# Altium footprint library microbuilder.PCBLIB: 422 footprints (part 2 of 27)
Each footprint in its own frame and in the unit in brackets; x right, y up, seen from the top. Pads: shape width x height; smd on the part's side, far side on the other; paste and mask are expansions set on the pad; w line width, h text height; cw(c..) or ccw(c..) is an arc to the next point about the centre after c.
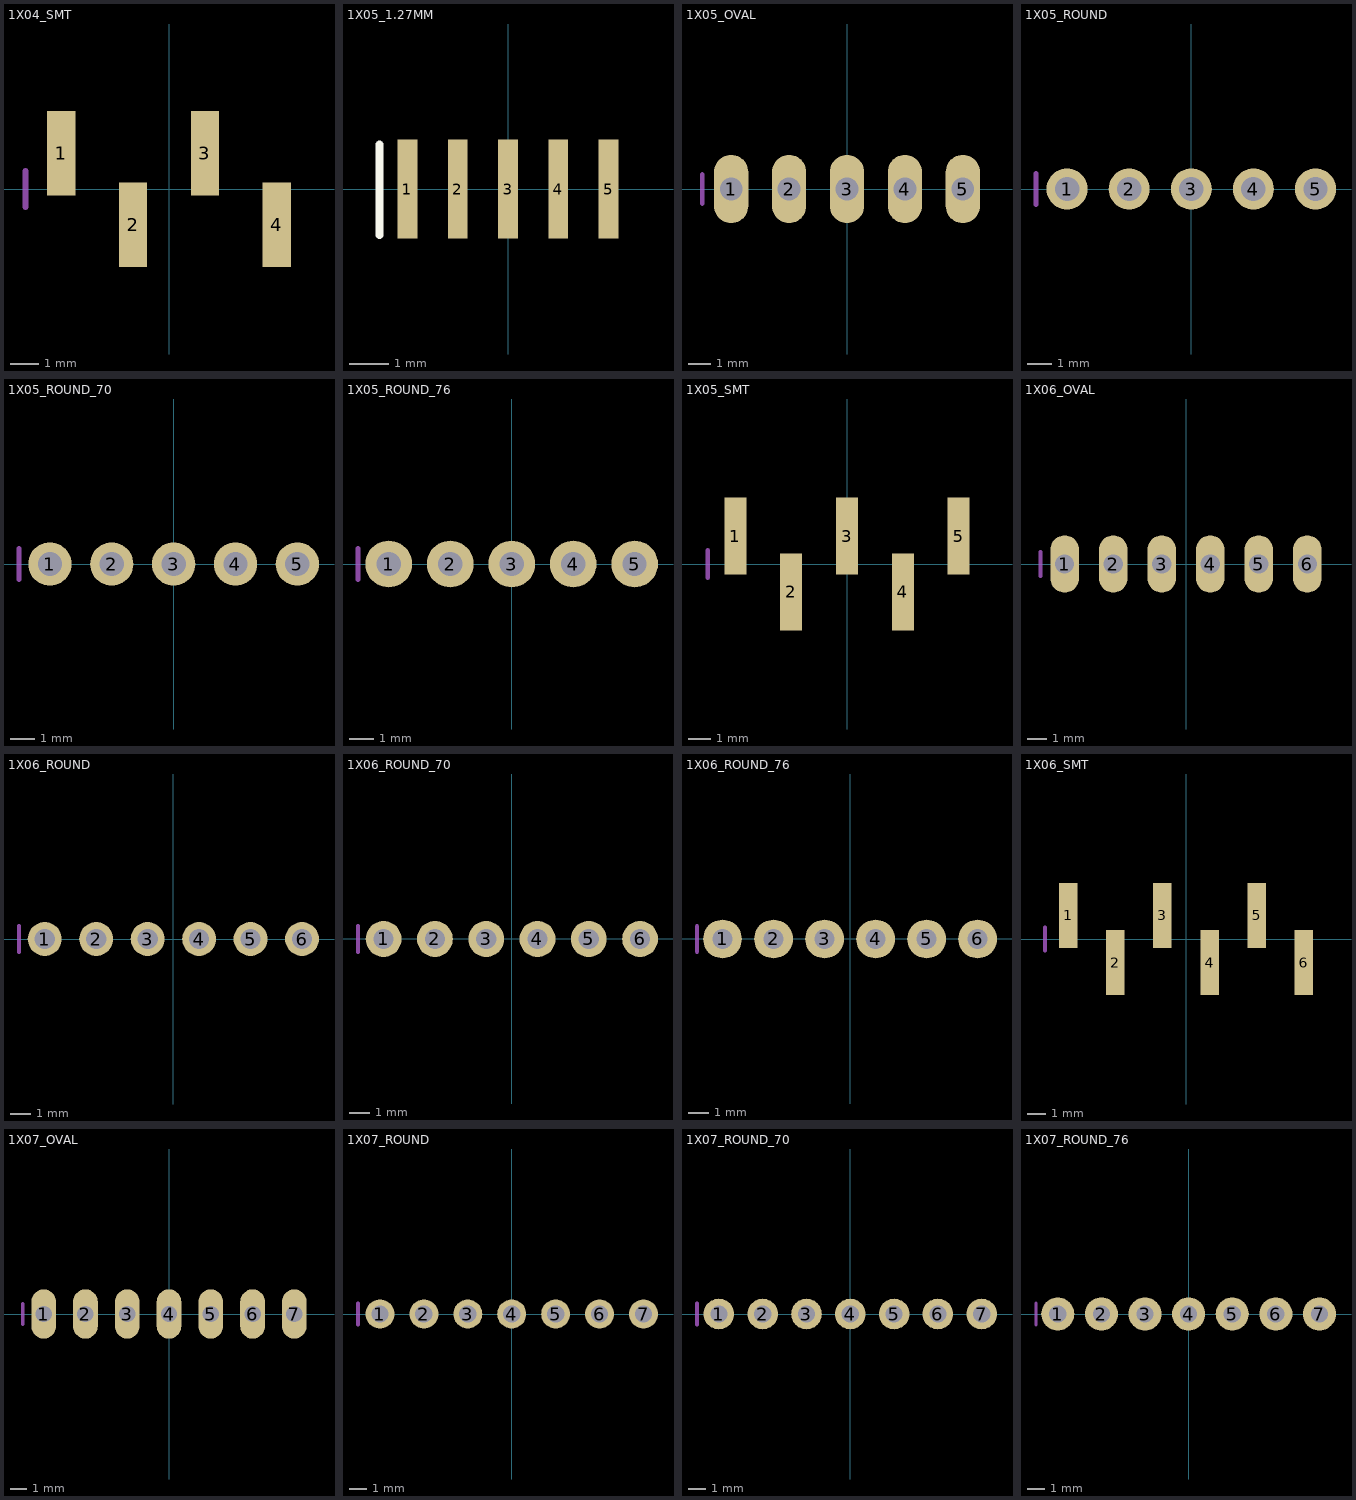
[diagram p1: the footprints below, top view; thin cyan lines are the x and y axes]

## 1X04_SMT [mm]
pads (4):
  rect 1x3 smd: 1(-3.81,1.27) 2(-1.27,-1.27) 3(1.27,1.27) 4(3.81,-1.27)
Mechanical 16:
  lines w0.203: -5.08,-0.635 -5.08,0.635

## 1X05_1.27MM [mm]
pads (5):
  rect 0.5x2.5 smd: 1(-2.54,0) 2(-1.27,0) 3(0,0) 4(1.27,0) 5(2.54,0)
Top Overlay:
  lines w0.203: -3.25,-1.159 -3.25,1.127

## 1X05_OVAL [mm]
pads (5):
  oval 1.5x3 hole 1: 1(-5.08,0) 2(-2.54,0) 3(0,0) 4(2.54,0) 5(5.08,0)
Mechanical 16:
  rectangle: 2.286,-0.254 2.794,0.254
  rectangle: -0.254,-0.254 0.254,0.254
  rectangle: -2.794,-0.254 -2.286,0.254
  rectangle: -5.334,-0.254 -4.826,0.254
  rectangle: 4.826,-0.254 5.334,0.254
  lines w0.203: -6.35,-0.635 -6.35,0.635

## 1X05_ROUND [mil]
pads (5):
  round 66 hole 39.37: 1(-200,0) 2(-100,0) 3(0,0) 4(100,0) 5(200,0)
Mechanical 16:
  rectangle: 90,-10 110,10
  rectangle: -10,-10 10,10
  rectangle: -110,-10 -90,10
  rectangle: -210,-10 -190,10
  rectangle: 190,-10 210,10
  lines w8: -250,-25 -250,25

## 1X05_ROUND_70 [mil]
pads (5):
  round 70 hole 39.37: 1(-200,0) 2(-100,0) 3(0,0) 4(100,0) 5(200,0)
Mechanical 16:
  rectangle: 90,-10 110,10
  rectangle: -10,-10 10,10
  rectangle: -110,-10 -90,10
  rectangle: -210,-10 -190,10
  rectangle: 190,-10 210,10
  lines w8: -250,-25 -250,25

## 1X05_ROUND_76 [mil]
pads (5):
  round 76 hole 39.37: 1(-200,0) 2(-100,0) 3(0,0) 4(100,0) 5(200,0)
Mechanical 16:
  rectangle: 90,-10 110,10
  rectangle: -10,-10 10,10
  rectangle: -110,-10 -90,10
  rectangle: -210,-10 -190,10
  rectangle: 190,-10 210,10
  lines w8: -250,-25 -250,25

## 1X05_SMT [mm]
pads (5):
  rect 1x3.5 smd: 1(-5.08,1.27) 2(-2.54,-1.27) 3(0,1.27) 4(2.54,-1.27) 5(5.08,1.27)
Mechanical 16:
  lines w0.203: -6.35,-0.635 -6.35,0.635

## 1X06_OVAL [mm]
pads (6):
  oval 1.5x3 hole 1: 1(-6.35,0) 2(-3.81,0) 3(-1.27,0) 4(1.27,0) 5(3.81,0) 6(6.35,0)
Mechanical 16:
  rectangle: 3.556,-0.254 4.064,0.254
  rectangle: 1.016,-0.254 1.524,0.254
  rectangle: -1.524,-0.254 -1.016,0.254
  rectangle: -4.064,-0.254 -3.556,0.254
  rectangle: -6.604,-0.254 -6.096,0.254
  rectangle: 6.096,-0.254 6.604,0.254
  lines w0.203: -7.62,-0.635 -7.62,0.635

## 1X06_ROUND [mil]
pads (6):
  round 66 hole 39.37: 1(-250,0) 2(-150,0) 3(-50,0) 4(50,0) 5(150,0) 6(250,0)
Mechanical 16:
  rectangle: 140,-10 160,10
  rectangle: 40,-10 60,10
  rectangle: -60,-10 -40,10
  rectangle: -160,-10 -140,10
  rectangle: -260,-10 -240,10
  rectangle: 240,-10 260,10
  lines w8: -300,-25 -300,25

## 1X06_ROUND_70 [mil]
pads (6):
  round 70 hole 39.37: 1(-250,0) 2(-150,0) 3(-50,0) 4(50,0) 5(150,0) 6(250,0)
Mechanical 16:
  rectangle: 140,-10 160,10
  rectangle: 40,-10 60,10
  rectangle: -60,-10 -40,10
  rectangle: -160,-10 -140,10
  rectangle: -260,-10 -240,10
  rectangle: 240,-10 260,10
  lines w8: -300,-25 -300,25

## 1X06_ROUND_76 [mil]
pads (6):
  round 76 hole 39.37: 1(-250,0) 2(-150,0) 3(-50,0) 4(50,0) 5(150,0) 6(250,0)
Mechanical 16:
  rectangle: 140,-10 160,10
  rectangle: 40,-10 60,10
  rectangle: -60,-10 -40,10
  rectangle: -160,-10 -140,10
  rectangle: -260,-10 -240,10
  rectangle: 240,-10 260,10
  lines w8: -300,-25 -300,25

## 1X06_SMT [mm]
pads (6):
  rect 1x3.5 smd: 1(-6.35,1.27) 2(-3.81,-1.27) 3(-1.27,1.27) 4(1.27,-1.27) 5(3.81,1.27) 6(6.35,-1.27)
Mechanical 16:
  lines w0.203: -7.62,-0.635 -7.62,0.635

## 1X07_OVAL [mm]
pads (7):
  oval 1.5x3 hole 1: 1(-7.62,0) 2(-5.08,0) 3(-2.54,0) 4(0,0) 5(2.54,0) 6(5.08,0) 7(7.62,0)
Mechanical 16:
  rectangle: 4.826,-0.254 5.334,0.254
  rectangle: 2.286,-0.254 2.794,0.254
  rectangle: -0.254,-0.254 0.254,0.254
  rectangle: -2.794,-0.254 -2.286,0.254
  rectangle: -5.334,-0.254 -4.826,0.254
  rectangle: -7.874,-0.254 -7.366,0.254
  rectangle: 7.366,-0.254 7.874,0.254
  lines w0.203: -8.89,-0.635 -8.89,0.635

## 1X07_ROUND [mil]
pads (7):
  round 66 hole 39.37: 1(-300,0) 2(-200,0) 3(-100,0) 4(0,0) 5(100,0) 6(200,0) 7(300,0)
Mechanical 16:
  rectangle: 190,-10 210,10
  rectangle: 90,-10 110,10
  rectangle: -10,-10 10,10
  rectangle: -110,-10 -90,10
  rectangle: -210,-10 -190,10
  rectangle: -310,-10 -290,10
  rectangle: 290,-10 310,10
  lines w8: -350,-25 -350,25

## 1X07_ROUND_70 [mil]
pads (7):
  round 70 hole 39.37: 1(-300,0) 2(-200,0) 3(-100,0) 4(0,0) 5(100,0) 6(200,0) 7(300,0)
Mechanical 16:
  rectangle: 190,-10 210,10
  rectangle: 90,-10 110,10
  rectangle: -10,-10 10,10
  rectangle: -110,-10 -90,10
  rectangle: -210,-10 -190,10
  rectangle: -310,-10 -290,10
  rectangle: 290,-10 310,10
  lines w8: -350,-25 -350,25

## 1X07_ROUND_76 [mil]
pads (7):
  round 76 hole 39.37: 1(-300,0) 2(-200,0) 3(-100,0) 4(0,0) 5(100,0) 6(200,0) 7(300,0)
Mechanical 16:
  rectangle: 190,-10 210,10
  rectangle: 90,-10 110,10
  rectangle: -10,-10 10,10
  rectangle: -110,-10 -90,10
  rectangle: -210,-10 -190,10
  rectangle: -310,-10 -290,10
  rectangle: 290,-10 310,10
  lines w8: -350,-25 -350,25